# Altium footprint library LimeMicroAltiumLib.PcbLib: 769 footprints (part 7 of 50)
Each footprint in its own frame and in the unit in brackets; x right, y up, seen from the top. Pads: shape width x height; smd on the part's side, far side on the other; paste and mask are expansions set on the pad; w line width, h text height; cw(c..) or ccw(c..) is an arc to the next point about the centre after c.
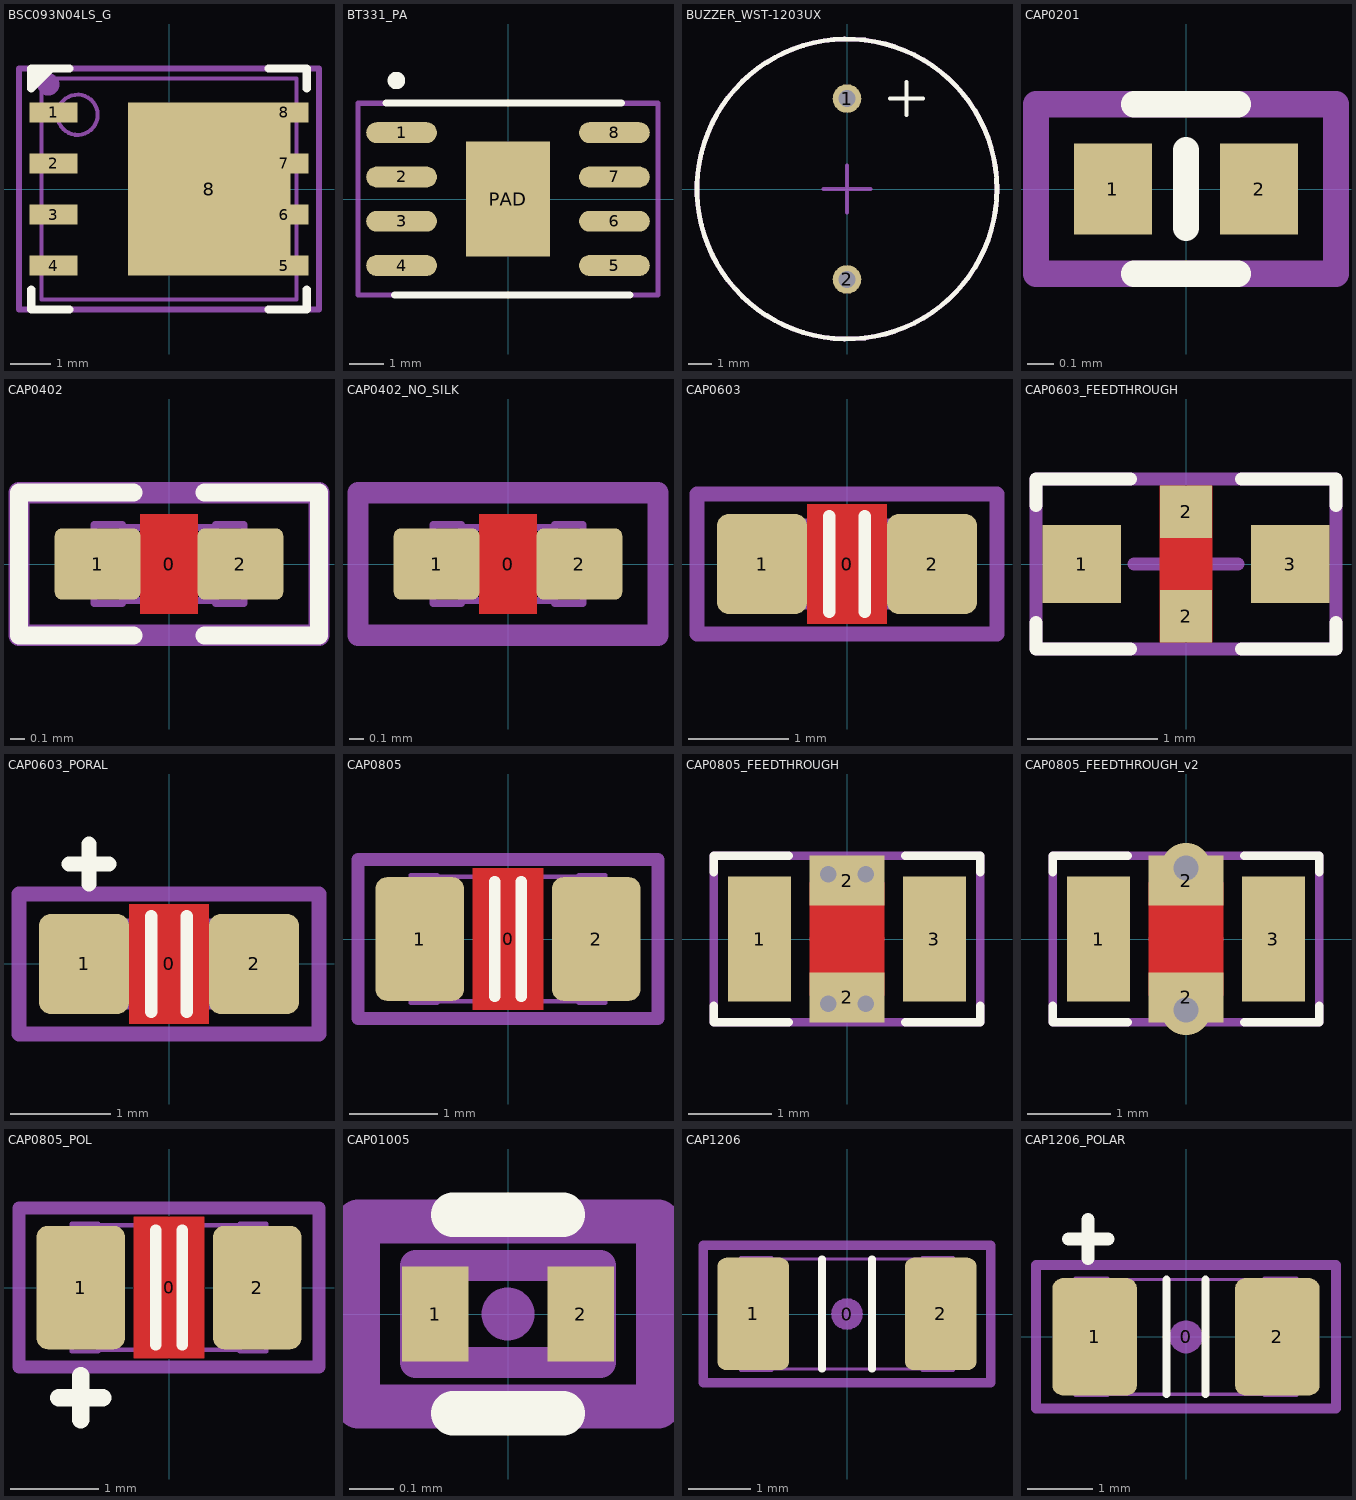
[diagram p6: the footprints below, top view; thin cyan lines are the x and y axes]

## BSC093N04LS_G [mm] "SON, 8-Leads, Body 5,32x6,15mm, Pitch 1,27mm, Thermal Pad 3,60x4,05mm, IPC Medium Density"
height 1.1
pads (9):
  rect 1.2x0.5 smd: 1(-2.87,1.905) 2(-2.87,0.635) 3(-2.87,-0.635) 4(-2.87,-1.905) 5(2.87,-1.905) 6(2.87,-0.635) 7(2.87,0.635) 8(2.87,1.905)
  rect 4.05x4.3 smd paste-2.025: 8(1,0)
Top Overlay:
  region: -3.425,2.5 -3.425,2.995 -3.416,2.986 -2.939,2.986
  lines w0.2: -3.425,-2.5 -3.425,-2.995 -2.47,-2.995 ; -2.939,2.986 -3.425,2.5 -3.425,2.995 -2.47,2.995 ; 2.47,-2.995 3.425,-2.995 3.425,-2.5 ; 2.47,2.995 3.425,2.995 3.425,2.5
Mechanical 13:
  circle w0.1: c-2.275,1.845 r0.5
  lines w0.1: -3.175,-2.745 -3.175,2.745 3.175,2.745 3.175,-2.745 -3.175,-2.745
Mechanical 15:
  circle w0.35: c-3,2.6 r0.1
  lines w0.15: -0.5,0 0.5,0 ; 0,-0.5 0,0.5 ; -3.73,-3 -3.73,3 3.73,3 3.73,-3 -3.73,-3
  text ".Designator" at 0,0 h0.55
3D body "User Library-TDSON-8-1.step": height 1, standoff 0, extent -3.075,-2.675 3.075,2.675

## BT331_PA [mm] "Berex BT331 RF PA"
pads (9):
  oval 2.03x0.6 smd mask+0.05: 1(-3.05,1.905) 2(-3.05,0.635) 3(-3.05,-0.635) 4(-3.05,-1.905) 5(3.05,-1.905) 6(3.05,-0.635) 7(3.05,0.635) 8(3.05,1.905)
  rect 2.41x3.3 smd mask+0.05: PAD(0,0)
Top Overlay:
  circle w0.3: c-3.2,3.4 r0.1
  lines w0.2: -3.5,2.75 3.25,2.75 ; -3.25,-2.75 3.5,-2.75
Mechanical 15:
  circle w0.3: c-3.15,1.925 r0.103
  lines w0.15: -0.5,0 0.5,0 ; 0,-0.5 0,0.5 ; -4.3,-2.75 -4.3,2.75 4.3,2.75 4.3,-2.75 -4.3,-2.75
  text ".Designator" at 0,0 h0.55
3D body "SOIC-8.STEP": height 1.75, standoff 0, extent -3,-2.45 3,2.45

## BUZZER_WST-1203UX [mm]
pads (2):
  round 1.2 hole 0.7 mask+0.05: 1(0,3.8) 2(0,-3.8)
Top Overlay:
  circle w0.2: c0,0 r6.3
  lines w0.15: 1.8,3.8 3.2,3.8 ; 2.5,3.1 2.5,4.5
Mechanical 15:
  circle w0.2: c0,0 r6.301
  lines w0.15: -1,0 0,0 ; 0,-1 0,0 ; 0,1 0,0 ; 1,0 0,0
  text "positive (longer pin)" at -5.3,2.4 h0.55
  text ".Designator" at 0,0 h0.55
3D body "User Library-WST-1203UX.step": height 9.65, standoff -4.5, extent -6,-6.027 6,9.427

## CAP0201 [mm]
pads (2):
  rect 0.3x0.35 smd mask+0.05: 1(-0.28,0) 2(0.28,0)
Top Overlay:
  lines w0.1: -0.2,-0.325 0.2,-0.325 ; -0.2,0.325 0.2,0.325 ; 0,-0.15 0,0.15
Mechanical 15:
  circle w0.05: c0,0 r0.025
  lines w0.1: -0.575,-0.325 -0.575,0.325 0.575,0.325 0.575,-0.325 -0.575,-0.325
  text ".Designator" at 0,0 h0.55
3D body: height 0.25, standoff 0, extent 0.17,-0.15 0.3,0.15
3D body: height 0.25, standoff 0, extent -0.3,-0.15 -0.17,0.15
3D body: height 0.25, standoff 0, extent -0.17,-0.15 0.17,0.15

## CAP0402 [mm] "Chip Capacitor, Body 1.0x0.5mm, 0402, IPC Medium Density"
height 0.55
pads (3):
  round 0.2 on Mech15: 0(0,0)
  rrect20% 0.6x0.5 smd: 1(-0.5,0) 2(0.5,0)
Top Layer:
  pour cut-out: -0.2,0.35 0.2,0.35 0.2,-0.35 -0.2,-0.35
Top Overlay:
  lines w0.127: -0.25,-0.5 -1.05,-0.5 -1.05,0.5 -0.25,0.5 ; 0.25,-0.5 1.05,-0.5 1.05,0.5 0.25,0.5
Mechanical 13:
  lines w0.05: -0.325,-0.255 0.325,-0.255 ; -0.325,0.255 0.325,0.255 ; -0.525,-0.275 -0.525,0.275 -0.325,0.275 -0.325,-0.275 -0.525,-0.275 ; 0.325,-0.275 0.525,-0.275 0.525,0.275 0.325,0.275 0.325,-0.275
Mechanical 15:
  lines w0.15: -1.05,-0.5 -1.05,0.5 1.05,0.5 1.05,-0.5 -1.05,-0.5
  text ".Designator" at 0,0 h0.55
3D body "CAP 0402 (1005 metric).STEP": height 0.55, standoff 0, extent -0.525,-0.275 0.525,0.275

## CAP0402_NO_SILK [mm] "Chip Capacitor, Body 1.0x0.5mm, 0402, IPC Medium Density"
height 0.55
pads (3):
  round 0.2 on Mech15: 0(0,0)
  rrect20% 0.6x0.5 smd: 1(-0.5,0) 2(0.5,0)
Top Layer:
  pour cut-out: -0.2,0.35 0.2,0.35 0.2,-0.35 -0.2,-0.35
Mechanical 13:
  lines w0.05: -0.325,-0.255 0.325,-0.255 ; -0.325,0.255 0.325,0.255 ; -0.525,-0.275 -0.525,0.275 -0.325,0.275 -0.325,-0.275 -0.525,-0.275 ; 0.325,-0.275 0.525,-0.275 0.525,0.275 0.325,0.275 0.325,-0.275
Mechanical 15:
  lines w0.15: -1.05,-0.5 -1.05,0.5 1.05,0.5 1.05,-0.5 -1.05,-0.5
  text ".Designator" at 0,0 h0.55
3D body "CAP 0402 (1005 metric).STEP": height 0.55, standoff 0, extent -0.525,-0.275 0.525,0.275

## CAP0603 [mm] "Chip Capacitor, Body 1.6x0.8mm, 0603, IPC Medium Density"
height 0.8
pads (3):
  round 0.254 on Mech15: 0(0,0)
  rrect25% 0.9x1 smd: 1(-0.85,0) 2(0.85,0)
Top Layer:
  pour cut-out: -0.4,0.6 0.4,0.6 0.4,-0.6 -0.4,-0.6
Top Overlay:
  lines w0.127: -0.178,-0.476 -0.178,0.476 ; 0.178,-0.476 0.178,0.476
Mechanical 13:
  lines w0.05: -0.55,-0.43 0.55,-0.43 ; -0.55,0.43 0.55,0.43 ; -0.85,-0.45 -0.85,0.45 -0.55,0.45 -0.55,-0.45 -0.85,-0.45 ; 0.55,-0.45 0.55,0.45 0.85,0.45 0.85,-0.45 0.55,-0.45
Mechanical 15:
  lines w0.15: -1.5,-0.7 -1.5,0.7 1.5,0.7 1.5,-0.7 -1.5,-0.7
  text ".Designator" at 0,0 h0.55
3D body "CAP_0603.STEP": height 0.89, standoff -0.01, extent -0.85,-0.45 0.85,0.45

## CAP0603_FEEDTHROUGH [mm]
pads (4):
  rect 0.6x0.6 smd mask+0.05: 1(-0.8,0) 3(0.8,0)
  rect 0.4x0.4 smd mask+0.05: 2(0,-0.4) 2(0,0.4)
Top Layer:
  region: -0.375,-0.4
  region: -0.2,-0.6 -0.2,0.6 0.2,0.6 0.2,-0.6
  region: 0.375,0.425
Top Overlay:
  lines w0.1: -1.15,-0.45 -1.15,-0.65 -0.425,-0.65 ; -1.15,0.45 -1.15,0.65 -0.425,0.65 ; 0.425,-0.65 1.15,-0.65 1.15,-0.45 ; 0.425,0.65 1.15,0.65 1.15,0.45
Mechanical 15:
  lines w0.1: -0.4,0 0,0 ; 0,-0.4 0,0 ; 0,0.4 0,0 ; 0.4,0 0,0 ; -1.15,-0.65 -1.15,0.65 1.15,0.65 1.15,-0.65 -1.15,-0.65
  text ".Designator" at 0,0 h0.55
3D body "User Library-Murata_NFM18PC_2Amp.STEP": height 0.6, standoff 0, extent -0.8,-0.4 0.8,0.4

## CAP0603_PORAL [mm] "Chip Capacitor, Body 1.6x0.8mm, 0603, IPC Medium Density"
height 0.8
pads (3):
  round 0.254 on Mech15: 0(0,0)
  rrect25% 0.9x1 smd: 1(-0.85,0) 2(0.85,0)
Top Layer:
  pour cut-out: -0.4,0.6 0.4,0.6 0.4,-0.6 -0.4,-0.6
Top Overlay:
  lines w0.127: -0.178,-0.476 -0.178,0.476 ; 0.178,-0.476 0.178,0.476
  lines w0.15: -1,1 -0.6,1 ; -0.8,0.8 -0.8,1.2
Mechanical 13:
  lines w0.05: -0.55,-0.43 0.55,-0.43 ; -0.55,0.43 0.55,0.43 ; -0.85,-0.45 -0.85,0.45 -0.55,0.45 -0.55,-0.45 -0.85,-0.45 ; 0.55,-0.45 0.55,0.45 0.85,0.45 0.85,-0.45 0.55,-0.45
Mechanical 15:
  lines w0.15: -1.1,0 -0.7,0 ; -0.9,-0.2 -0.9,0.2 ; -1.5,-0.7 -1.5,0.7 1.5,0.7 1.5,-0.7 -1.5,-0.7
  text "Anode" at -1.4,-0.6 h0.3
  text ".Designator" at 0,0 h0.55
3D body "CAP_0603.STEP": height 0.89, standoff -0.01, extent -0.85,-0.45 0.85,0.45

## CAP0805 [mm] "Chip Capacitor, Body 2.0x1.2mm, 0805, IPC Medium Density"
height 1.2
pads (3):
  round 0.254 on Mech15: 0(0,0)
  rrect25% 1x1.4 smd: 1(-1,0) 2(1,0)
Top Layer:
  pour cut-out: -0.4,0.8 0.4,0.8 0.4,-0.8 -0.4,-0.8
Top Overlay:
  lines w0.127: -0.15,-0.651 -0.15,0.651 ; 0.15,-0.651 0.15,0.651
Mechanical 13:
  lines w0.05: -0.8,-0.705 0.8,-0.705 ; -0.8,0.705 0.8,0.705 ; -1.1,-0.725 -1.1,0.725 -0.8,0.725 -0.8,-0.725 -1.1,-0.725 ; 0.8,-0.725 1.1,-0.725 1.1,0.725 0.8,0.725 0.8,-0.725
Mechanical 15:
  lines w0.15: -1.7,-0.9 -1.7,0.9 1.7,0.9 1.7,-0.9 -1.7,-0.9
  text ".Designator" at 0,0 h0.55
3D body "CAP_0805.STEP": height 1.34, standoff -0.01, extent -1.1,-0.725 1.1,0.725

## CAP0805_FEEDTHROUGH [mm]
pads (4):
  rect 0.75x1.5 smd mask+0.05: 1(-1.05,0) 3(1.05,0)
  rect 0.9x0.6 smd mask+0.05: 2(0,-0.7) 2(0,0.7)
via 0.225,0.775 diameter 0.4 hole 0.2
via -0.225,0.775 diameter 0.4 hole 0.2
via 0.225,-0.775 diameter 0.4 hole 0.2
via -0.225,-0.775 diameter 0.4 hole 0.2
Top Layer:
  region: 0.375,0.425
  region: -0.45,-0.675 -0.45,0.675 0.45,0.675 0.45,-0.675
  region: -0.375,-0.4
Top Overlay:
  lines w0.1: -1.6,-0.8 -1.6,-1 -0.7,-1 ; -1.6,0.8 -1.6,1 -0.7,1 ; 0.7,-1 1.6,-1 1.6,-0.8 ; 0.7,1 1.6,1 1.6,0.8
Mechanical 15:
  lines w0.1: -0.4,0 0,0 ; 0,-0.4 0,0 ; 0,0.4 0,0 ; 0.4,0 0,0 ; -1.6,-1 1.6,-1 1.6,1 -1.6,1 -1.6,-1
  text ".Designator" at 0,0 h0.55
3D body "User Library-0805_3Pin_Capacitor.step": height 1.13, standoff -0.01, extent -1,-0.625 1,0.625

## CAP0805_FEEDTHROUGH_v2 [mm]
pads (4):
  rect 0.75x1.5 smd mask+0.05: 1(-1.05,0) 3(1.05,0)
  rect 0.9x0.6 smd mask+0.05: 2(0,-0.7) 2(0,0.7)
via 0,-0.85 diameter 0.6 hole 0.3
via 0,0.85 diameter 0.6 hole 0.3
Top Layer:
  region: -0.375,-0.4
  region: -0.45,-0.675 -0.45,0.675 0.45,0.675 0.45,-0.675
  region: 0.375,0.425
Top Overlay:
  lines w0.1: -1.6,-0.8 -1.6,-1 -0.7,-1 ; -1.6,0.8 -1.6,1 -0.7,1 ; 0.7,-1 1.6,-1 1.6,-0.8 ; 0.7,1 1.6,1 1.6,0.8
Mechanical 15:
  lines w0.1: -0.4,0 0,0 ; 0,-0.4 0,0 ; 0,0.4 0,0 ; 0.4,0 0,0 ; -1.6,-1 -1.6,1 1.6,1 1.6,-1 -1.6,-1
  text ".Designator" at 0,0 h0.55
3D body "User Library-0805_3Pin_Capacitor.step": height 1.13, standoff -0.01, extent -1,-0.625 1,0.625

## CAP0805_POL [mm] "Chip Capacitor, Body 2.0x1.2mm, 0805, IPC Medium Density"
height 1.2
pads (3):
  round 0.254 on Mech15: 0(0,0)
  rrect25% 1x1.4 smd: 1(-1,0) 2(1,0)
Top Layer:
  pour cut-out: -0.4,0.8 0.4,0.8 0.4,-0.8 -0.4,-0.8
Top Overlay:
  lines w0.127: -0.15,-0.651 -0.15,0.651 ; 0.15,-0.651 0.15,0.651
  lines w0.2: -1.25,-1.25 -0.75,-1.25 ; -1,-1.5 -1,-1
Mechanical 13:
  lines w0.05: -0.8,-0.705 0.8,-0.705 ; -0.8,0.705 0.8,0.705 ; -1.1,-0.725 -0.8,-0.725 -0.8,0.725 -1.1,0.725 -1.1,-0.725 ; 0.8,-0.725 0.8,0.725 1.1,0.725 1.1,-0.725 0.8,-0.725
Mechanical 15:
  lines w0.15: -1.2,0 -0.7,0 ; -0.95,-0.25 -0.95,0.25 ; -1.7,-0.9 1.7,-0.9 1.7,0.9 -1.7,0.9 -1.7,-0.9
  text ".Designator" at 0,0 h0.55
3D body "CAP_0805.STEP": height 1.34, standoff -0.01, extent -1.1,-0.725 1.1,0.725

## CAP01005 [mm]
pads (2):
  rect 0.15x0.215 smd paste+0 mask+0.03: 1(-0.165,0) 2(0.165,0)
Top Overlay:
  lines w0.1: -0.125,-0.225 0.125,-0.225 ; -0.125,0.225 0.125,0.225
Mechanical 13:
  lines w0.07: -0.21,-0.11 -0.21,0.11 0.21,0.11 0.21,-0.11 -0.21,-0.11
Mechanical 15:
  circle w0.07: c0,0 r0.025
  lines w0.1: -0.34,-0.21 -0.34,0.21 0.34,0.21 0.34,-0.21 -0.34,-0.21
  text ".Designator" at 0,0 h0.55
3D body "Cap_Murata_GRM0225C1H3R4CA03L_eec.STEP": height 0.25, standoff 0, extent -0.34,-0.21 0.34,0.21

## CAP1206 [mm] "Chip Capacitor, Body 3.2x1.6mm, 1206, IPC Medium Density"
height 1.6
pads (3):
  round 0.508 on Mech15: 0(0,0)
  rrect25% 1.15x1.8 smd: 1(-1.5,0) 2(1.5,0)
Top Overlay:
  lines w0.127: -0.4,-0.876 -0.4,0.876 ; 0.4,-0.876 0.4,0.876
Mechanical 13:
  lines w0.05: -1.2,-0.88 1.2,-0.88 ; -1.2,0.88 1.2,0.88 ; -1.7,-0.9 -1.2,-0.9 -1.2,0.9 -1.7,0.9 -1.7,-0.9 ; 1.2,-0.9 1.7,-0.9 1.7,0.9 1.2,0.9 1.2,-0.9
Mechanical 15:
  lines w0.15: -2.3,-1.1 -2.3,1.1 2.3,1.1 2.3,-1.1 -2.3,-1.1
  text ".Designator" at 0,0 h0.55
3D body "CAP_1206.STEP": height 1.74, standoff -0.01, extent -1.7,-0.9 1.7,0.9

## CAP1206_POLAR [mm]
height 1.6
pads (3):
  round 0.508 on Mech15: 0(0,0)
  rrect25% 1.3x1.8 smd: 1(-1.4,0) 2(1.4,0)
Top Overlay:
  lines w0.127: -0.3,-0.876 -0.3,0.876 ; 0.3,-0.876 0.3,0.876
  lines w0.2: -1.8,1.5 -1.2,1.5 ; -1.5,1.2 -1.5,1.8
Mechanical 13:
  lines w0.05: -1.2,-0.88 1.2,-0.88 ; -1.2,0.88 1.2,0.88 ; -1.7,-0.9 -1.7,0.9 -1.2,0.9 -1.2,-0.9 -1.7,-0.9 ; 1.2,-0.9 1.2,0.9 1.7,0.9 1.7,-0.9 1.2,-0.9
Mechanical 15:
  lines w0.15: -1.6,0 -1.2,0 ; -1.4,-0.2 -1.4,0.2 ; -2.3,-1.1 2.3,-1.1 2.3,1.1 -2.3,1.1 -2.3,-1.1
  text ".Designator" at 0,0 h0.55
  text "Anode" at -2,-0.8 h0.3
3D body "User Library-CAP_TANT_3216-18_A_case-1.step": height 1.7, standoff 0, extent -1.7,-0.9 1.7,0.9